# Altium footprint library Connectors.PcbLib: 135 footprints (part 5 of 9)
Each footprint in its own frame and in the unit in brackets; x right, y up, seen from the top. Pads: shape width x height; smd on the part's side, far side on the other; paste and mask are expansions set on the pad; w line width, h text height; cw(c..) or ccw(c..) is an arc to the next point about the centre after c.
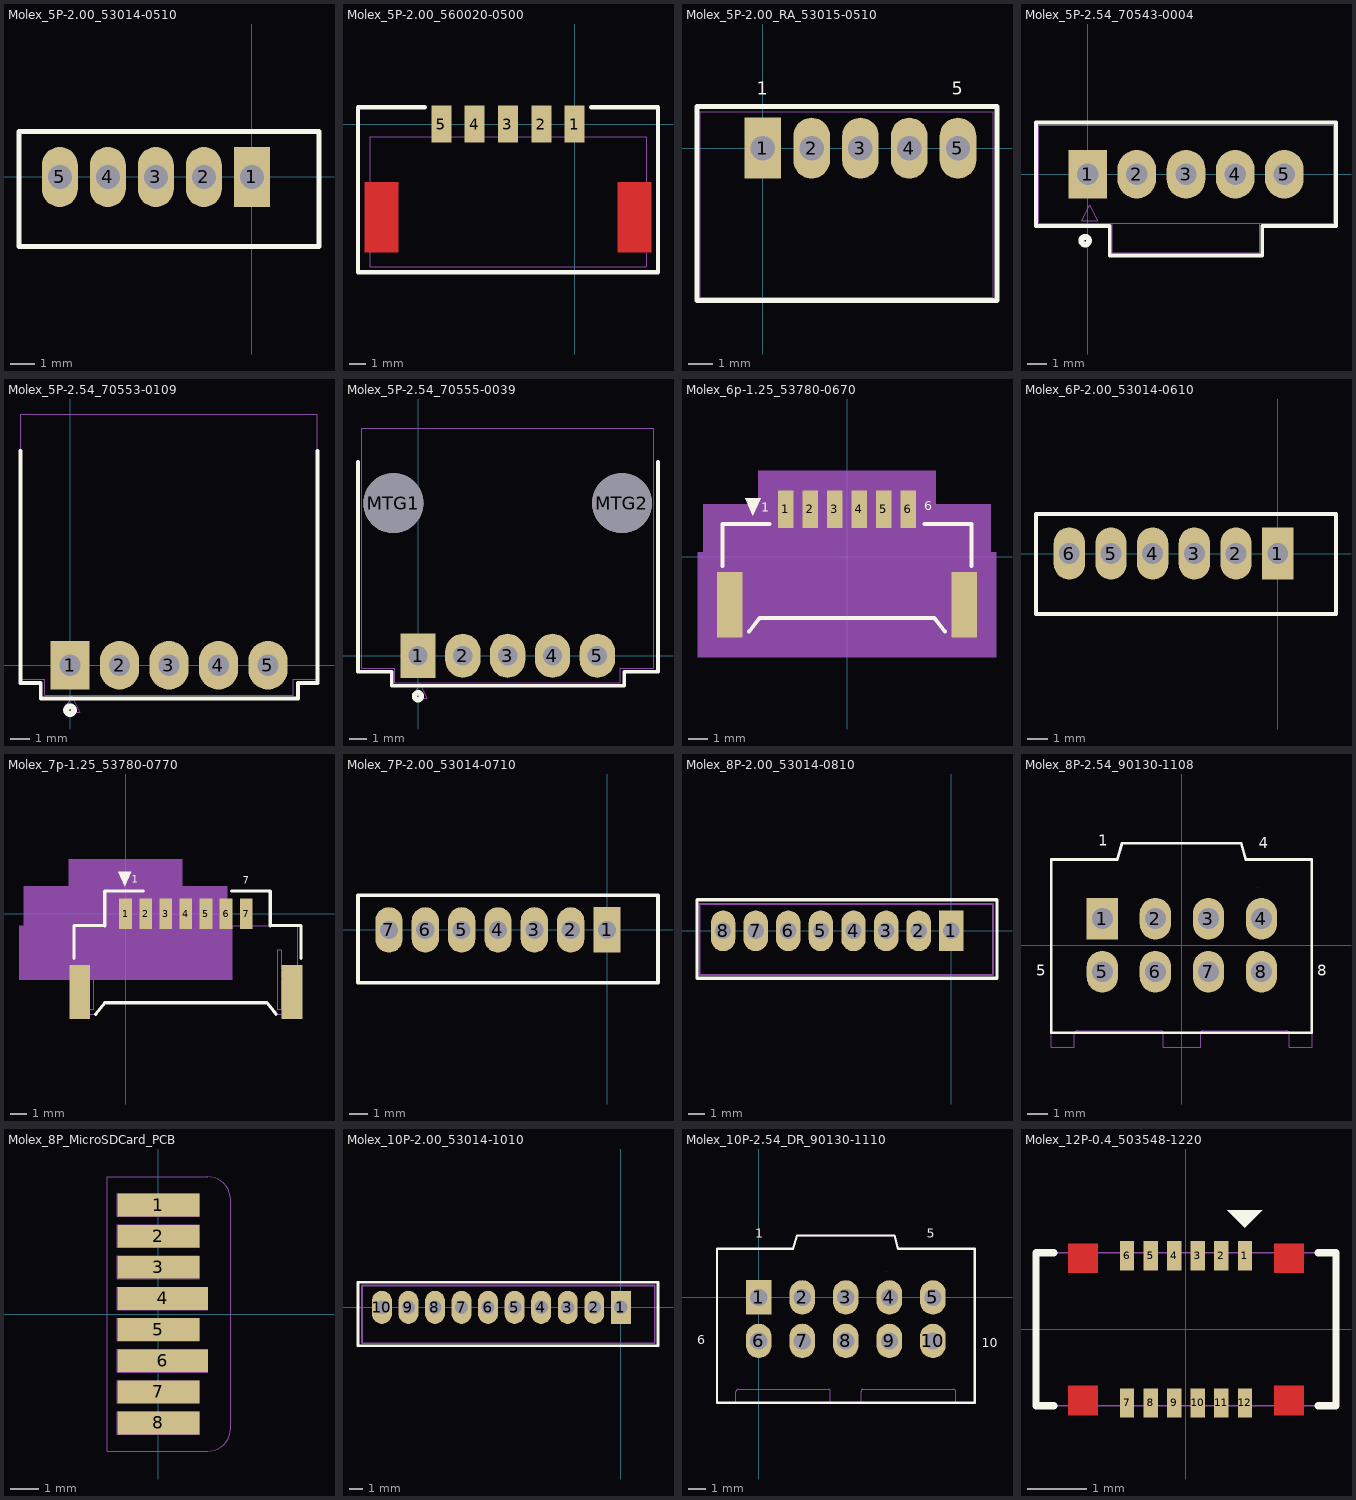
[diagram p4: the footprints below, top view; thin cyan lines are the x and y axes]

## Molex_5P-2.00_53014-0510 [mm] "Connector Header 5pos 2mmp Vertical through hole"
height 6
pads (5):
  rect 1.5x2.5 hole 1: 1(0,0)
  oval 1.5x2.5 hole 1: 2(-2,0) 3(-4,0) 4(-6,0) 5(-8,0)
Top Overlay:
  lines w0.2: -9.7,-2.9 2.8,-2.9 2.8,1.9 -9.7,1.9 -9.7,-2.9
3D body "530140510.stp": height 5.85, standoff -3.5, extent -9.44,-2.7 2.56,1.65

## Molex_5P-2.00_560020-0500 [mm] "Connector Header 5pos 2mmp Vertical SMT"
height 8
pads (5):
  rect 1.2x2.2 smd: 1(0,0) 2(-2,0) 3(-4,0) 4(-6,0) 5(-8,0)
Top Layer:
  region: -12.6,-3.48 -10.6,-3.48 -10.6,-7.68 -12.6,-7.68
  region: 4.6,-3.48 2.6,-3.48 2.6,-7.68 4.6,-7.68
Top Overlay:
  lines w0.254: -9,1 -13,1 -13,-8.9 5,-8.9 5,1 1,1
Mechanical 1:
  lines w0.025: -12.3,-8.575 4.3,-8.575 4.3,-0.775 -12.3,-0.775 -12.3,-8.575 ; -8.25,-0.775 -8.25,0.575 -7.75,0.575 -7.75,-0.775 -8.25,-0.775 ; -6.25,-0.775 -5.75,-0.775 -5.75,0.575 -6.25,0.575 -6.25,-0.775 ; -4.25,-0.775 -3.75,-0.775 -3.75,0.575 -4.25,0.575 -4.25,-0.775 ; -2.25,-0.775 -1.75,-0.775 -1.75,0.575 -2.25,0.575 -2.25,-0.775 ; -0.25,-0.775 0.25,-0.775 0.25,0.575 -0.25,0.575 -0.25,-0.775
  text ".Designator" at -4.5,-5.4 h1.52
  text "1" at -0.1,-2.3 h1
  text "5" at -8.4,-2.4 h1
3D body "5600200500.stp": height 8, standoff 0, extent -12.3,-8.65 4.3,0.5

## Molex_5P-2.00_RA_53015-0510 [mm] "Connector Header 5pos 2mmp RA through hole"
height 6
pads (5):
  rect 1.5x2.5 hole 1: 1(0,0)
  oval 1.5x2.5 hole 1: 2(2,0) 3(4,0) 4(6,0) 5(8,0)
Top Overlay:
  lines w0.2: -2.7,-6.25 -2.7,1.7 9.6,1.7 9.6,-6.25 -2.7,-6.25
  text "5" at 7.75,2 h0.9
  text "1" at -0.25,2 h0.9
Mechanical 1:
  lines w0.025: -2.56,-0.161 -2.56,-0.161 -2.56,-6.11 -2.56,-6.11 -0.16,-6.11 ; -2.56,-0.161 -2.56,-0.16 ; -2.56,-0.16 -2.56,-0.16 -2.56,1.49 9.44,1.49 ; -0.16,-6.11 9.44,-6.11 9.44,1.489 ; -0.16,-6.11 -0.16,-6.11 ; 9.44,1.49 9.44,1.489
  text ".Designator" at 1.8,-4 h1.52
  text "1" at -0.25,-2.5 h1
  text "5" at 7.75,-2.5 h1
3D body "530150510.stp": height 4.65, standoff -3.5, extent -2.56,-6.11 9.44,1.49

## Molex_5P-2.54_70543-0004 [mm] "Connector Header 5pos 2.54mmp vertical through hole"
height 6
pads (5):
  rect 2x2.5 hole 1.1: 1(0,0)
  oval 2x2.5 hole 1.1: 2(2.54,0) 3(5.08,0) 4(7.62,0) 5(10.16,0)
Top Overlay:
  circle w0.3: c-0.127,-3.429 r0.2
  lines w0.2: -2.667,2.667 -2.667,-2.667 1.143,-2.667 1.143,-4.191 9.017,-4.191 9.017,-2.667 12.827,-2.667 12.827,2.667
  lines w0.203: -2.667,2.667 12.827,2.667
Mechanical 1:
  circle w0.025: c10.16,0 r0.52
  circle w0.025: c7.62,0 r0.52
  circle w0.025: c5.08,0 r0.52
  circle w0.025: c2.54,0 r0.52
  circle w0.025: c0,0 r0.52
  lines w0.025: -1.305,-2.54 6.35,-2.54 12.7,-2.54 12.7,2.54 -2.525,2.54 -2.525,-2.54 1.27,-2.54 1.27,-4.064 8.89,-4.064 8.89,-2.54 ; -0.3,-2.4 0.5,-2.4 0.1,-1.6 -0.3,-2.4
  text ".Designator" at -0.381,3.175 h1.52
Mechanical 13:
  circle w0.025: c0,0 r0.551
  circle w0.025: c2.54,0 r0.551
  circle w0.025: c5.08,0 r0.551
3D body "705430004.stp": height 11.81, standoff -3.3, extent -2.54,-4.064 12.7,2.54

## Molex_5P-2.54_70553-0109 [mm] "Connector Header 5pos 2.54mmp right angle through hole"
height 6
pads (5):
  rect 2x2.5 hole 1.1: 1(0,0)
  oval 2x2.5 hole 1.1: 2(2.54,0) 3(5.08,0) 4(7.62,0) 5(10.16,0)
Top Overlay:
  circle w0.3: c0,-2.3 r0.2
  lines w0.2: -2.54,11 -2.54,-0.9 -1.5,-0.9 -1.5,-1.7 11.7,-1.7 11.7,-0.9 12.7,-0.9 12.7,11
Mechanical 1:
  circle w0.025: c0,0 r0.52
  circle w0.025: c2.54,0 r0.52
  lines w0.025: -2.54,-0.705 -2.54,12.895 12.7,12.895 12.7,-0.705 11.46,-0.705 11.46,-1.53 -1.305,-1.53 -1.305,-0.705 -2.54,-0.705 ; -0.3,-2.4 0.1,-1.6 0.5,-2.4 -0.3,-2.4
  text ".Designator" at 2.946,5.512 h1.52
3D body "705530109.stp": height 6.98, standoff -3.3, extent -2.54,-0.698 12.7,12.89

## Molex_5P-2.54_70555-0039 [mm] "Connector Header 5pos 2.54mmp right angle through hole"
height 6
pads (7):
  rect 2x2.5 hole 1.1: 1(0,0)
  oval 2x2.5 hole 1.1: 2(2.54,0) 3(5.08,0) 4(7.62,0) 5(10.16,0)
  round 3.4 hole 3.4 unplated: MTG1(-1.4,8.64) MTG2(11.56,8.64)
Top Overlay:
  circle w0.3: c0,-2.3 r0.2
  lines w0.2: -3.4,11 -3.4,-0.9 -1.5,-0.9 -1.5,-1.7 11.7,-1.7 11.7,-0.9 13.6,-0.9 13.6,11
Mechanical 1:
  circle w0.025: c0,0 r0.52
  circle w0.025: c2.54,0 r0.52
  lines w0.025: -3.18,-0.705 -3.18,12.895 13.36,12.895 13.36,-0.705 11.46,-0.705 11.46,-1.53 -1.305,-1.53 -1.305,-0.705 -3.18,-0.705 ; -0.3,-2.4 0.1,-1.6 0.5,-2.4 -0.3,-2.4
  text ".Designator" at 1.32,5.5 h1.52
3D body "705550039.stp": height 6.98, standoff -3.3, extent -3.175,-0.698 13.335,12.89

## Molex_6p-1.25_53780-0670 [mil] "Molex Panelmate Connector 6p 1.25mm pitch"
height 73
pads (8):
  rect 31x75 smd: 1(-123.03,95.96) 2(-73.82,95.96) 3(-24.61,95.96) 4(24.61,95.96) 5(73.82,95.96) 6(123.03,95.96)
  rect 51x132 smd: " "(-235.24,-95.96) " "(235.24,-95.96)
Top Overlay:
  region: -173.23,117.62 -204.72,117.62 -188.98,82.19
  lines w8: -250,-18.21 -250,66.44 -155.51,66.44 ; -196.85,-150.1 -175.2,-122.54 175.2,-122.54 196.85,-150.1 ; 155.51,66.44 250,66.44 250,-18.21
  text "6" at 154.92,88.09 h31
  text "1" at -171.85,84.15 h31
Mechanical 1:
  lines w1: -249.02,-45.77 -210.63,-45.77 -210.63,-61.52 -218.5,-61.52 -218.5,-150.1 -217.72,-150.1 ; -249.02,-41.83 -210.63,-41.83 -210.63,7.38 -200.79,7.38 -200.79,-138.29 -210.63,-138.29 -210.63,-65.45 -214.57,-65.45 -214.57,-150.1 ; -130.91,66.44 -130.91,105.81 -115.16,105.81 -115.16,66.44 ; -130.91,90.06 -115.16,90.06 ; -81.69,66.44 -81.69,105.81 -65.94,105.81 -65.94,66.44 ; -81.69,90.06 -65.94,90.06 ; -32.48,66.44 -32.48,105.81 -16.73,105.81 -16.73,66.44 ; -32.48,90.06 -16.73,90.06 ; 16.73,66.44 16.73,105.81 32.48,105.81 32.48,66.44 ; 16.73,90.06 32.48,90.06 ; 65.94,66.44 65.94,105.81 81.69,105.81 81.69,66.44 ; 65.94,90.06 81.69,90.06 ; 115.16,66.44 115.16,105.81 130.91,105.81 130.91,66.44 ; 115.16,90.06 130.91,90.06 ; 214.57,-150.1 214.57,-65.45 210.63,-65.45 210.63,-138.29 200.79,-138.29 200.79,7.38 210.63,7.38 210.63,-41.83 249.02,-41.83 ; 217.72,-150.1 218.5,-150.1 218.5,-61.52 210.63,-61.52 210.63,-45.77 249.02,-45.77 ; -249.02,-150.1 -227.36,-150.1 -225,-150.1 -217.91,-150.1 -201.77,-150.1 -195.87,-150.1 -175.2,-122.54 175.2,-122.54 195.87,-150.1 201.77,-150.1 217.91,-150.1 225,-150.1 227.36,-150.1 249.02,-150.1 249.02,-116.24 249.02,-114.27 249.02,66.44 -249.02,66.44 -249.02,-114.27 -249.02,-116.24 -249.02,-150.1 ; -139.76,34.94 -108.27,34.94 -124.02,66.44 -139.76,34.94
  text ".Designator" at -37.2,-132.38 h31
  text "6" at 150.99,90.06 h31
  text "1" at -177.75,90.06 h31
Mechanical 11:
  pour cut-out: -249.02,66.44 -138.54,66.44 -138.54,133.48 138.54,133.48 138.54,66.44 249.02,66.44 249.02,-29.94 260.75,-29.94 260.75,-161.99 -260.75,-161.99 -260.75,-29.94 -249.02,-29.94
Mechanical 13:
  pour cut-out: -288.39,9.43 -288.39,105.81 -177.91,105.81 -177.91,172.85 177.91,172.85 177.91,105.81 288.39,105.81 288.39,9.43 300.12,9.43 300.12,-201.36 -300.12,-201.36 -300.12,9.43

## Molex_6P-2.00_53014-0610 [mm] "Connector Header 6pos 2mmp Vertical through hole"
height 6
pads (6):
  rect 1.5x2.5 hole 1: 1(0,0)
  oval 1.5x2.5 hole 1: 2(-2,0) 3(-4,0) 4(-6,0) 5(-8,0) 6(-10,0)
Top Overlay:
  lines w0.2: -11.6,-2.9 -11.6,1.9 2.8,1.9 2.8,-2.9 -11.6,-2.9
Mechanical 1:
  text ".Designator" at -6.6,2.3 h1.52
3D body "530140610.stp": height 5.85, standoff -3.5, extent -11.44,-2.7 2.56,1.65

## Molex_7p-1.25_53780-0770 [mil] "Molex Panelmate Connector 7p 1.25mm pitch"
height 73
pads (9):
  rect 31x75 smd: 1(0,0) 2(49.21,0) 3(98.43,0) 4(147.64,0) 5(196.85,0) 6(246.06,0) 7(295.28,0)
  rect 51x132 smd: " "(407.48,-191.93) ""(-112.2,-191.93)
Top Overlay:
  region: 13.78,102.36 -17.72,102.36 -1.97,66.93
  lines w7.87: -125.98,-110.24 -125.98,-29.53 ; -51.18,-29.53 -125.98,-29.53 ; 354.33,-29.53 429.13,-29.53 429.13,-110.24 ; -125.98,-29.53 -125.98,-29.53
  lines w8: -72.83,-246.06 -51.18,-218.5 346.46,-218.5 368.11,-246.06 ; -51.18,-29.53 -51.18,55.12 43.31,55.12 ; 259.84,55.12 354.33,55.12 354.33,-29.53
  text "1" at 15.16,68.9 h31
  text "7" at 287.4,66.93 h31
Mechanical 1:
  lines w1: -125.98,-141.73 -87.6,-141.73 -87.6,-157.48 -95.47,-157.48 -95.47,-246.06 -94.69,-246.06 ; -125.98,-137.8 -87.6,-137.8 -87.6,-88.58 -77.76,-88.58 -77.76,-234.25 -87.6,-234.25 -87.6,-161.42 -91.54,-161.42 -91.54,-246.06 ; -7.87,-29.53 -7.87,9.84 ; 7.87,-29.53 7.87,9.84 ; 41.34,-29.53 41.34,9.84 57.09,9.84 57.09,-29.53 ; 41.34,-5.91 57.09,-5.91 ; 90.55,-29.53 90.55,9.84 106.3,9.84 106.3,-29.53 ; 90.55,-5.91 106.3,-5.91 ; 139.76,-29.53 139.76,9.84 155.51,9.84 155.51,-29.53 ; 139.76,-5.91 155.51,-5.91 ; 188.98,-29.53 188.98,9.84 204.72,9.84 204.72,-29.53 ; 188.98,-5.91 204.72,-5.91 ; 238.19,-29.53 238.19,9.84 253.94,9.84 253.94,-29.53 ; 238.19,-5.91 253.94,-5.91 ; 287.4,-29.53 287.4,9.84 303.15,9.84 303.15,-29.53 ; 287.4,-5.91 303.15,-5.91 ; 386.81,-246.06 386.81,-161.42 382.87,-161.42 382.87,-234.25 373.03,-234.25 373.03,-88.58 382.87,-88.58 382.87,-137.8 421.26,-137.8 ; 389.96,-246.06 390.75,-246.06 390.75,-157.48 382.87,-157.48 382.87,-141.73 421.26,-141.73 ; -7.87,9.84 7.87,9.84 ; -7.87,9.84 7.87,9.84 ; -125.98,-246.06 -125.98,-212.2 -125.98,-210.24 -125.98,-29.53 421.26,-29.53 421.26,-210.24 421.26,-212.2 421.26,-246.06 399.61,-246.06 397.24,-246.06 390.16,-246.06 374.02,-246.06 368.11,-246.06 347.44,-218.5 -52.17,-218.5 -72.83,-246.06 -78.74,-246.06 -94.88,-246.06 -101.97,-246.06 -104.33,-246.06 -125.98,-246.06 ; -16.08,-76.2 -0.33,-44.7 15.42,-76.2 -16.08,-76.2 ; -7.87,-5.91 7.87,-5.91 -7.87,-5.91
  text "1" at -5.51,-5.91 h31
  text "7" at 323.23,-5.91 h31
  text ".Designator" at 86.26,-141.91 h31
Mechanical 11:
  pour cut-out: -249.02,66.44 -138.54,66.44 -138.54,133.48 138.54,133.48 138.54,66.44 249.02,66.44 249.02,-29.94 260.75,-29.94 260.75,-161.99 -260.75,-161.99 -260.75,-29.94 -249.02,-29.94
3D body "537800770.stp": height 74.8, standoff 0, extent -127.94,-246.05 419.3,9.85

## Molex_7P-2.00_53014-0710 [mm] "Connector Header 7pos 2mmp Vertical through hole"
height 6
pads (7):
  rect 1.5x2.5 hole 1: 1(0,0)
  oval 1.5x2.5 hole 1: 2(-2,0) 3(-4,0) 4(-6,0) 5(-8,0) 6(-10,0) 7(-12,0)
Top Overlay:
  lines w0.2: -13.7,-2.9 -13.7,1.9 2.8,1.9 2.8,-2.9 -13.7,-2.9
Mechanical 1:
  text ".Designator" at -6,2.4 h1.52
3D body "530140710.stp": height 5.85, standoff -3.5, extent -13.44,-2.7 2.56,1.65

## Molex_8P-2.00_53014-0810 [mm] "Connector Header 8pos 2mmp Vertical through hole"
height 6
pads (8):
  rect 1.5x2.5 hole 1: 1(0,0)
  oval 1.5x2.5 hole 1: 2(-2,0) 3(-4,0) 4(-6,0) 5(-8,0) 6(-10,0) 7(-12,0) 8(-14,0)
Top Overlay:
  lines w0.2: -15.6,-2.9 2.8,-2.9 2.8,1.9 -15.6,1.9 -15.6,-2.9
Mechanical 1:
  circle w0.127: c-2,0 r0.5
  circle w0.127: c-4,0 r0.5
  circle w0.127: c-6,0 r0.5
  circle w0.127: c-8,0 r0.5
  circle w0.127: c-10,0 r0.5
  circle w0.127: c-12,0 r0.5
  circle w0.127: c-14,0 r0.5
  lines w0.127: -15.44,-2.7 2.56,-2.7 2.56,1.65 -15.44,1.65 -15.44,-2.7
  text "8" at -14.1,1.9 h1
  text "1" at -0.2,1.9 h1
  text ".Designator" at -7.1,2.4 h1.52
3D body "Molex_530140810.stp": height 5.85, standoff -3.5, extent -15.44,-2.7 2.56,1.65

## Molex_8P-2.54_90130-1108 [mm] "Connector Header 8pos dual row 2.54mmp through hole"
height 11
pads (8):
  rect 1.5x2 hole 1: 1(-3.81,1.27)
  oval 1.5x2 hole 1: 2(-1.27,1.27) 3(1.27,1.27) 4(3.81,1.27) 5(-3.81,-1.27) 6(-1.27,-1.27) 7(1.27,-1.27) 8(3.81,-1.27)
Top Overlay:
  lines w0.127: -6.25,-4.191 6.223,-4.191 6.223,4.1 3.053,4.1 2.845,4.875 -2.868,4.875 -3.103,4.1 -6.25,4.1 -6.25,-4.191
  text "5" at -6.985,-1.651 h0.9
  text "8" at 6.477,-1.651 h0.9
  text "4" at 3.683,4.445 h0.9
  text "1" at -4.01,4.57 h0.9
Mechanical 1:
  circle w0.025: c-3.81,1.27 r0.5
  circle w0.025: c-1.27,1.27 r0.5
  circle w0.025: c1.27,1.27 r0.5
  circle w0.025: c3.81,1.27 r0.5
  circle w0.025: c3.81,-1.27 r0.5
  circle w0.025: c1.27,-1.27 r0.5
  circle w0.025: c-1.27,-1.27 r0.5
  circle w0.025: c-3.81,-1.27 r0.5
  lines w0.025: -6.25,-4.875 -6.25,4.1 -3.053,4.1 -2.845,4.875 2.845,4.875 3.053,4.1 6.25,4.1 6.25,-4.875 ; -6.25,-4.875 -5.15,-4.875 -5.15,-4.25 cw(c-5,-4.25) -5,-4.1 -1,-4.1 cw(c-1,-4.2) -0.9,-4.2 -0.9,-4.875 0.9,-4.875 0.9,-4.2 cw(c1,-4.2) 1,-4.1 5,-4.1 cw(c5,-4.25) 5.15,-4.25 5.15,-4.875 6.25,-4.875 ; 3.63,2.76 3.63,2.76
  text ".Designator" at -1.651,5.715 h1.52
  text "1" at -4.01,2.47 h1
  text "4" at 4.058,2.597 h1
  text "8" at 3.758,-3.403 h1
  text "5" at -4.21,-3.53 h1
3D body "901301108.stp": height 10.9, standoff -2.9, extent -6.25,-4.875 6.25,4.875

## Molex_8P_MicroSDCard_PCB [mm] "Connector Card Edge 8pos MicroSD"
pads (8):
  rect 2.9x0.8 smd: 1(0,3.85) 2(0,2.75) 3(0,1.65) 5(0,-0.55) 7(0,-2.75) 8(0,-3.85)
  rect 3.2x0.8 smd: 4(0.15,0.55) 6(0.15,-1.65)
Mechanical 1:
  lines w0.025: -1.8,-4.85 -1.8,4.85 1.75,4.85 cw(c1.75,4.05) 2.55,4.05 2.55,-4.05 cw(c1.75,-4.05) 1.75,-4.85 -1.8,-4.85 ; -1.45,-4.25 -1.45,-3.45 1.45,-3.45 1.45,-4.25 -1.45,-4.25 ; -1.45,-3.15 1.45,-3.15 1.45,-2.35 -1.45,-2.35 -1.45,-3.15 ; -1.45,-2.05 -1.45,-1.25 1.75,-1.25 1.75,-2.05 -1.45,-2.05 ; -1.45,-0.95 -1.45,-0.15 1.45,-0.15 1.45,-0.95 -1.45,-0.95 ; -1.45,0.15 -1.45,0.95 1.75,0.95 1.75,0.15 -1.45,0.15 ; -1.45,1.25 1.45,1.25 1.45,2.05 -1.45,2.05 -1.45,1.25 ; -1.45,2.35 -1.45,3.15 1.45,3.15 1.45,2.35 -1.45,2.35 ; -1.45,3.45 -1.45,4.25 1.45,4.25 1.45,3.45 -1.45,3.45
  text ".Designator" at 2.9,-0.15 h1.52

## Molex_10P-2.00_53014-1010 [mm] "Connector Header 10pos 2mmp Vertical through hole"
height 6
pads (10):
  rect 1.5x2.5 hole 1: 1(0,0)
  oval 1.5x2.5 hole 1: 2(-2,0) 3(-4,0) 4(-6,0) 5(-8,0) 6(-10,0) 7(-12,0) 8(-14,0) 9(-16,0) 10(-18,0)
Top Overlay:
  lines w0.2: -19.8,-2.9 -19.8,1.9 2.8,1.9 2.8,-2.9 -19.8,-2.9
Mechanical 1:
  circle w0.127: c-14,0 r0.5
  circle w0.127: c-12,0 r0.5
  circle w0.127: c-10,0 r0.5
  circle w0.127: c-8,0 r0.5
  circle w0.127: c-6,0 r0.5
  circle w0.127: c-4,0 r0.5
  circle w0.127: c-2,0 r0.5
  lines w0.127: -19.5,-2.7 -19.5,1.65 2.56,1.65 2.56,-2.7 -19.5,-2.7
  text ".Designator" at -10,2.1 h1.52
  text "1" at -0.2,2.1 h1
  text "10" at -18.6,2.1 h1
3D body "530141010.stp": height 5.85, standoff -3.5, extent -19.44,-2.7 2.56,1.65

## Molex_10P-2.54_DR_90130-1110 [mm] "Connector Header 10pos dual row 2.54mmp through hole"
height 11
pads (10):
  rect 1.5x2 hole 1: 1(0,0)
  oval 1.5x2 hole 1: 2(2.54,0) 3(5.08,0) 4(7.62,0) 5(10.16,0) 6(0,-2.54) 7(2.54,-2.54) 8(5.08,-2.54) 9(7.62,-2.54) 10(10.16,-2.54)
Top Overlay:
  lines w0.127: -2.44,-6.145 12.6,-6.145 12.6,2.83 8.133,2.83 7.925,3.605 2.235,3.605 2,2.83 -2.44,2.83 -2.44,-6.145
  text "6" at -3.6,-2.9 h0.9
  text "10" at 13,-3.1 h0.9
  text "5" at 9.8,3.3 h0.9
  text "1" at -0.2,3.3 h0.9
Mechanical 1:
  circle w0.025: c0,0 r0.5
  circle w0.025: c2.54,0 r0.5
  circle w0.025: c5.08,0 r0.5
  circle w0.025: c7.62,0 r0.5
  circle w0.025: c10.16,0 r0.5
  circle w0.025: c10.16,-2.54 r0.5
  circle w0.025: c7.62,-2.54 r0.5
  circle w0.025: c5.08,-2.54 r0.5
  circle w0.025: c2.54,-2.54 r0.5
  circle w0.025: c0,-2.54 r0.5
  lines w0.025: -2.44,-6.145 -2.44,2.83 2.027,2.83 2.235,3.605 7.925,3.605 8.133,2.83 12.6,2.83 12.6,-6.145 ; -2.44,-6.145 -1.34,-6.145 -1.34,-5.52 cw(c-1.19,-5.52) -1.19,-5.37 4.08,-5.37 cw(c4.08,-5.47) 4.18,-5.47 4.18,-6.145 5.98,-6.145 5.98,-5.47 cw(c6.08,-5.47) 6.08,-5.37 11.35,-5.37 cw(c11.35,-5.52) 11.5,-5.52 11.5,-6.145 12.6,-6.145 ; 7.44,1.49 7.44,1.49
  text ".Designator" at 2.9,4.1 h1.52
  text "1" at -0.2,1.2 h1
  text "5" at 9.9,1.2 h1
  text "10" at 9.6,-4.8 h1
  text "6" at -0.4,-4.8 h1
3D body "901301110.stp": height 10.9, standoff -2.9, extent -2.44,-6.145 12.6,3.605

## Molex_12P-0.4_503548-1220 [mm] "Connector BtB 12pos 0.4mm SMT"
height 0.439
pads (12):
  rect 0.24x0.5 smd: 1(1,1.25) 2(0.6,1.25) 3(0.2,1.25) 4(-0.2,1.25) 5(-0.6,1.25) 6(-1,1.25) 7(-1,-1.25) 8(-0.6,-1.25) 9(-0.2,-1.25) 10(0.2,-1.25) 11(0.6,-1.25) 12(1,-1.25)
Top Layer:
  region: 1.5,1.46 2,1.46 2,0.96 1.5,0.96
  region: 1.5,-1.46 2,-1.46 2,-0.96 1.5,-0.96
  region: -1.5,-1.46 -2,-1.46 -2,-0.96 -1.5,-0.96
  region: -1.5,1.46 -2,1.46 -2,0.96 -1.5,0.96
Top Overlay:
  region: 0.7,2.025 1.3,2.025 1,1.725
  lines w0.127: -2.25,-1.3 -2.55,-1.3 -2.55,-1.3 -2.55,1.3 -2.25,1.3 ; 2.25,-1.3 2.55,-1.3 2.55,-1.3 2.55,1.3 2.25,1.3
Mechanical 1:
  lines w0.025: 2.55,-1.3 -2.54,-1.3 -2.54,1.3 2.55,1.3 2.55,-1.3 ; 2.55,-1.3 2.55,-1.3 ; 2.55,-1.3 2.55,-1.3
  text "12" at 0.925,-2.15 h0.5
  text "7" at -1.075,-2.15 h0.5
  text "6" at -1.075,1.65 h0.5
  text "1" at 0.925,1.65 h0.5
  text ".Designator" at -0.9,-0.35 h1
3D body "5035481220.stp": height 0.67, standoff -0.01, extent -2.55,-1.3 2.55,1.3